# Altium footprint library MOLEX THD.PcbLib: 71 footprints (part 4 of 5)
Each footprint in its own frame and in the unit in brackets; x right, y up, seen from the top. Pads: shape width x height; smd on the part's side, far side on the other; paste and mask are expansions set on the pad; w line width, h text height; cw(c..) or ccw(c..) is an arc to the next point about the centre after c.
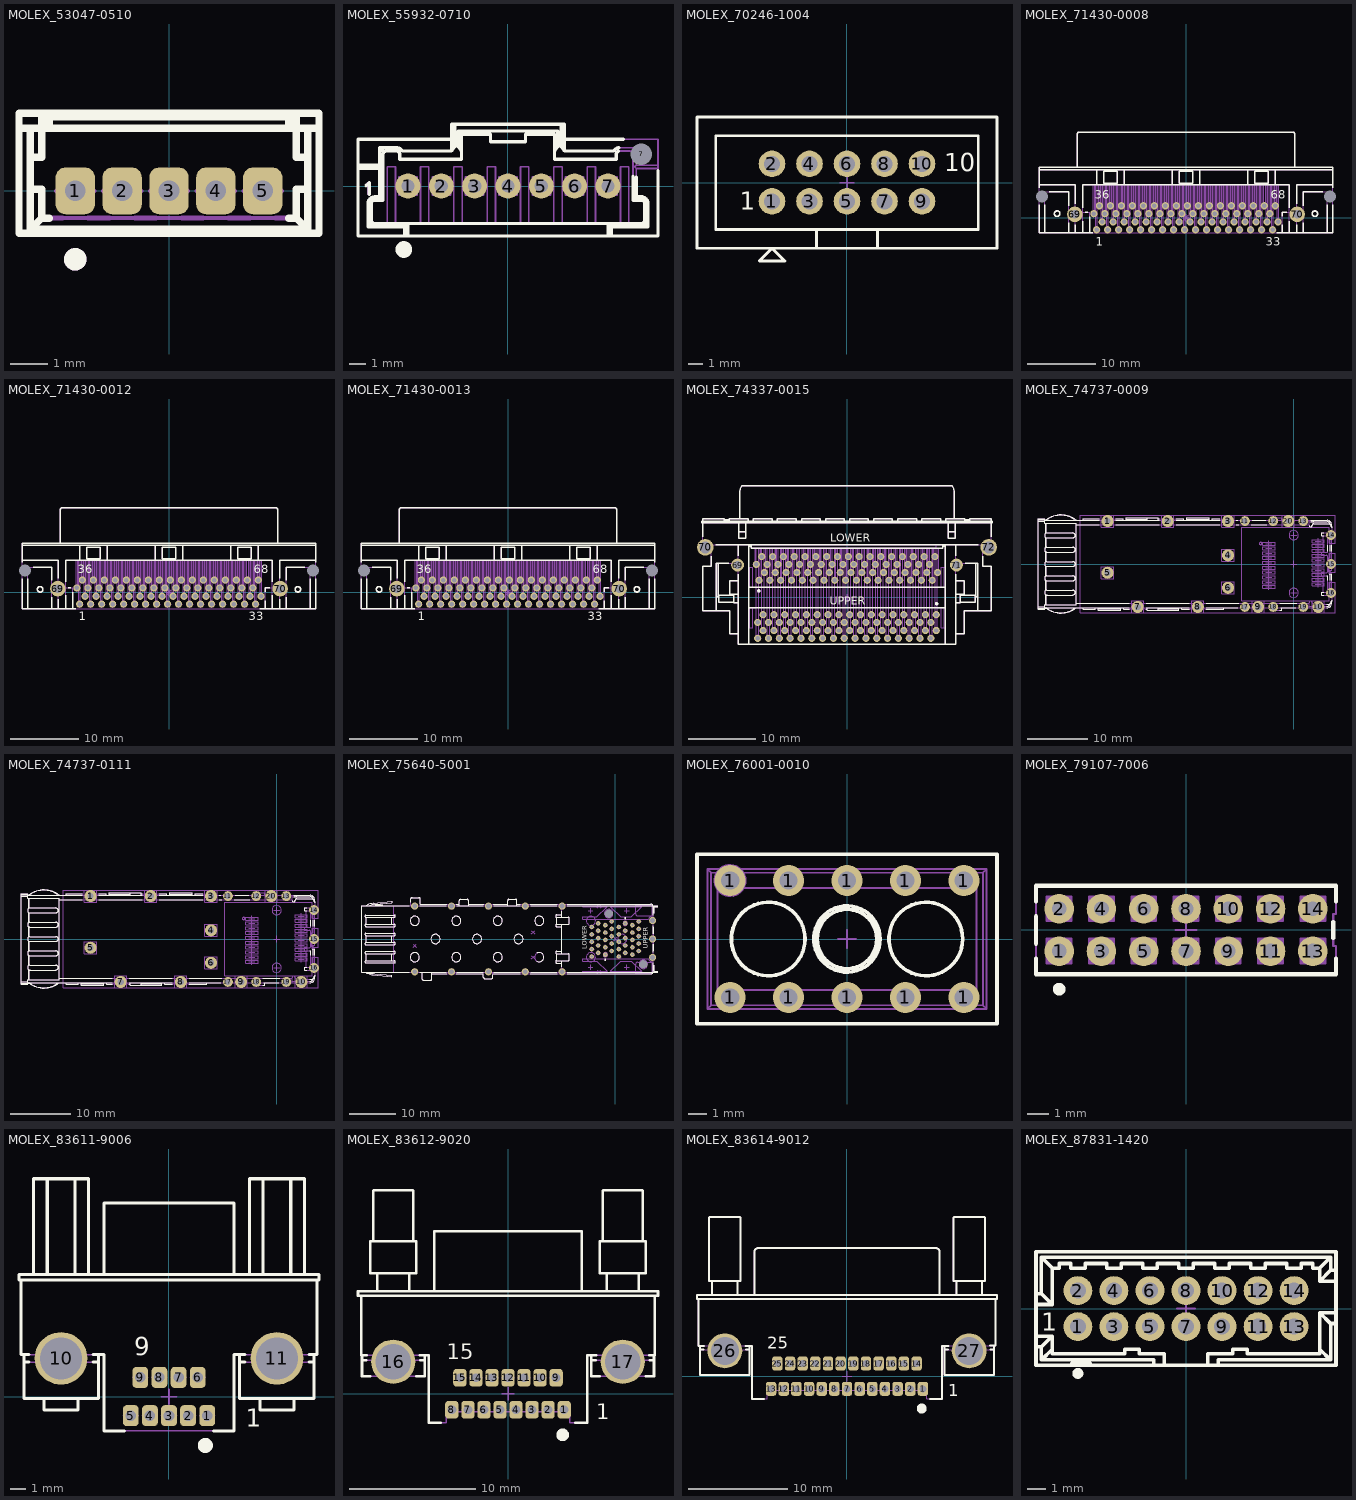
[diagram p3: the footprints below, top view; thin cyan lines are the x and y axes]

## MOLEX_53047-0510 [mm] "1.25mm Pitch PicoBlade™ Wire-to-Board 5 Circuits Vertical Header with Friction Lock"
height 4.2
pads (5):
  rrect50% 1.05x1.25 hole 0.55: 1(-2.5,0) 2(-1.25,0) 3(0,0) 4(1.25,0) 5(2.5,0)
Top Overlay:
  circle w0.3: c-2.5,-1.825 r0.15
  lines w0.2: -4,1.675 4,1.675 ; -3.7,0.05 -3.4,0.05 -3.4,-0.725 ; -3.7,0.9 -3.4,0.9 -3.4,1.975 3.4,1.975 3.4,0.9 3.7,0.9 ; -3.7,1.675 -3.7,-1.025 ; -3.2,-0.725 -3.4,-0.725 ; -3.2,1.675 -3.2,2.075 ; 3.2,-0.725 3.4,-0.725 ; 3.2,1.675 3.2,2.075 ; 3.7,0.05 3.4,0.05 3.4,-0.725 ; 3.7,1.675 3.7,-1.025 ; -3.7,-1.025 3.7,-1.025 ; -3.7,-1.025 -3.4,-0.725 ; 3.4,-0.725 3.7,-1.025 ; -4,-1.125 4,-1.125 4,2.075 -4,2.075 -4,-1.125
Mechanical 3:
  lines w0.127: -3,0 -2.5,0 ; -2.5,-0.5 -2.5,0 ; -2.5,0.5 -2.5,0 ; -2,0 -2.5,0 ; -1.75,0 -1.25,0 ; -1.25,-0.5 -1.25,0 ; -1.25,0.5 -1.25,0 ; -0.75,0 -1.25,0 ; -0.5,0 0,0 ; 0,-0.5 0,0 ; 0,0.5 0,0 ; 0.5,0 0,0 ; 0.75,0 1.25,0 ; 1.25,-0.5 1.25,0 ; 1.75,0 1.25,0 ; 2,0 2.5,0 ; 2.5,-0.5 2.5,0 ; 2.5,0.5 2.5,0 ; 3,0 2.5,0 ; 1.25,0 1.25,0.5 1.25,0
Mechanical 4:
  lines w0.127: -4,1.675 4,1.675 ; -3.7,0.05 -3.4,0.05 -3.4,-0.725 ; -3.7,0.9 -3.4,0.9 -3.4,1.975 3.4,1.975 3.4,0.9 3.7,0.9 ; -3.7,1.675 -3.7,-1.025 ; -3.2,1.675 -3.2,2.075 ; -2.838,-0.725 -3.4,-0.725 ; -2.162,-0.725 -1.588,-0.725 ; -0.912,-0.725 -0.338,-0.725 ; 0.338,-0.725 0.912,-0.725 ; 1.588,-0.725 2.162,-0.725 ; 2.838,-0.725 3.4,-0.725 ; 3.2,1.675 3.2,2.075 ; 3.7,0.05 3.4,0.05 3.4,-0.725 ; 3.7,1.675 3.7,-1.025 ; -3.7,-1.025 3.7,-1.025 ; -3.7,-1.025 -3.4,-0.725 ; 3.4,-0.725 3.7,-1.025 ; -4,-1.125 4,-1.125 4,2.075 -4,2.075 -4,-1.125
Mechanical 8:
  lines w0.1: -3,0 -2.5,0 ; -2.5,-0.5 -2.5,0 ; -2.5,0.5 -2.5,0 ; -2,0 -2.5,0 ; -1.75,0 -1.25,0 ; -1.25,-0.5 -1.25,0 ; -1.25,0.5 -1.25,0 ; -0.75,0 -1.25,0 ; -0.5,0 0,0 ; 0,-0.5 0,0 ; 0,0.5 0,0 ; 0.5,0 0,0 ; 0.75,0 1.25,0 ; 1.25,-0.5 1.25,0 ; 1.75,0 1.25,0 ; 2,0 2.5,0 ; 2.5,-0.5 2.5,0 ; 2.5,0.5 2.5,0 ; 3,0 2.5,0 ; 1.25,0 1.25,0.5 1.25,0
Mechanical 14:
  circle w0.3: c-2.5,-1.825 r0.15
  lines w0.1: -4,1.675 4,1.675 ; -3.7,0.05 -3.4,0.05 -3.4,-0.725 ; -3.7,0.9 -3.4,0.9 -3.4,1.975 3.4,1.975 3.4,0.9 3.7,0.9 ; -3.7,1.675 -3.7,-1.025 ; -3.2,1.675 -3.2,2.075 ; 3.2,1.675 3.2,2.075 ; 3.7,0.05 3.4,0.05 3.4,-0.725 ; 3.7,1.675 3.7,-1.025 ; -3.7,-1.025 3.7,-1.025 ; -3.7,-1.025 -3.4,-0.725 ; -3.4,-0.725 3.4,-0.725 ; -2.66,-0.35 -2.34,-0.35 ; -2.66,-0.35 -2.66,0.35 ; -2.66,-0.35 -2.525,-0.225 ; -2.66,0.35 -2.34,0.35 ; -2.66,0.35 -2.525,0.225 ; -2.525,-0.225 -2.475,-0.225 ; -2.525,-0.225 -2.525,0.225 ; -2.525,0.225 -2.475,0.225 ; -2.475,-0.225 -2.475,0.225 ; -2.475,-0.225 -2.34,-0.35 ; -2.475,0.225 -2.34,0.35 ; -2.34,-0.35 -2.34,0.35 ; -1.41,-0.35 -1.09,-0.35 ; -1.41,-0.35 -1.41,0.35 ; -1.41,-0.35 -1.275,-0.225 ; -1.41,0.35 -1.09,0.35 ; -1.41,0.35 -1.275,0.225 ; -1.275,-0.225 -1.225,-0.225 ; -1.275,-0.225 -1.275,0.225 ; -1.275,0.225 -1.225,0.225 ; -1.225,-0.225 -1.225,0.225 ; -1.225,-0.225 -1.09,-0.35 ; -1.225,0.225 -1.09,0.35 ; -1.09,-0.35 -1.09,0.35 ; -0.16,-0.35 0.16,-0.35 ; -0.16,-0.35 -0.16,0.35 ; -0.16,-0.35 -0.025,-0.225 ; -0.16,0.35 0.16,0.35 ; -0.16,0.35 -0.025,0.225 ; -0.025,-0.225 0.025,-0.225 ; -0.025,-0.225 -0.025,0.225 ; -0.025,0.225 0.025,0.225 ; 0.025,-0.225 0.025,0.225 ; 0.025,-0.225 0.16,-0.35 ; 0.025,0.225 0.16,0.35 ; 0.16,-0.35 0.16,0.35 ; 1.09,-0.35 1.41,-0.35 ; 1.09,-0.35 1.09,0.35 ; 1.09,-0.35 1.225,-0.225 ; 1.09,0.35 1.41,0.35 ; 1.09,0.35 1.225,0.225 ; 1.225,-0.225 1.275,-0.225 ; 1.225,-0.225 1.225,0.225 ; 1.225,0.225 1.275,0.225 ; 1.275,-0.225 1.275,0.225 ; 1.275,-0.225 1.41,-0.35 ; 1.275,0.225 1.41,0.35 ; 1.41,-0.35 1.41,0.35 ; 2.34,-0.35 2.66,-0.35 ; 2.34,-0.35 2.34,0.35 ; 2.34,-0.35 2.475,-0.225 ; 2.34,0.35 2.66,0.35 ; 2.34,0.35 2.475,0.225 ; 2.475,-0.225 2.525,-0.225 ; 2.475,-0.225 2.475,0.225 ; 2.475,0.225 2.525,0.225 ; 2.525,-0.225 2.525,0.225 ; 2.525,-0.225 2.66,-0.35 ; 2.525,0.225 2.66,0.35 ; 2.66,-0.35 2.66,0.35 ; 3.4,-0.725 3.7,-1.025 ; -4,-1.125 4,-1.125 4,2.075 -4,2.075 -4,-1.125
3D body "MOLEX_53047-0510.stp": height 4.2, standoff -2.2, extent -4,-1.125 4,2.075

## MOLEX_55932-0710 [mm] "2.00mm Pitch MicroClasp Wire-to-Board Header, Single Row, Vertical, 7 Circuits, with PCB Locator"
height 9.75
pads (8):
  round 1.5 hole 0.8: 1(-6,0) 2(-4,0) 3(-2,0) 4(0,0) 5(2,0) 6(4,0) 7(6,0)
  round 0.5 hole 1.3 unplated mask+0.4: 7(8,1.9)
Top Overlay:
  circle w0.5: c-6.25,-3.81 r0.25
  lines w0.2: -9,1.05 -7.7,1.05 ; -9,1.25 -7.7,1.25 ; -8.524,0.001 -8.325,0.2 -8.325,-0.5 ; -8.2,-2.05 ccw(c-8,-2.05) -8,-2.25 ; -7.6,1.15 -7.7,1.25 ; -7.5,1.25 -7.7,1.05 ; -7.441,2.041 -7.7,2.3 ; -6.2,-3 -6.2,-2.45 ; -6,-3 -6,-2.25 ; -3.39,2.8 -9,2.8 -9,-3 9,-3 9,0.92 ; -3.19,3.7 -3.19,2.4 ; -2.79,2.1 -2.99,2.4 ; 2.79,2.1 2.99,2.4 ; 3.19,3.7 3.19,2.4 ; 3.39,2.8 6.928,2.8 ; 6,-3 6,-2.25 ; 6.2,-3 6.2,-2.45 ; 6.612,2.079 ccw(c6.7,1.9) 6.5,1.9 6.5,1.6 2.79,1.6 2.79,3.1 1.05,3.1 1.05,2.65 -1.05,2.65 -1.05,3.1 -2.79,3.1 ; 6.658,2.298 ccw(c6.7,1.9) 6.354,2.1 3.39,2.1 ; 7.5,0.592 7.5,-0.85 ; 7.7,0.533 7.7,-0.65 ; 8,-2.25 ccw(c8,-2.05) 8.2,-2.05 ; -8.4,-2.45 -8.4,-1.05 ; -8.4,-2.45 -8.2,-2.25 ; -8.4,-2.45 -6.2,-2.45 ; -8.4,-1.05 cw(c-8,-1.05) -8,-0.65 ; -8.4,-1.05 -8.2,-1.05 ; -8.2,-2.25 -8.2,-1.05 ; -8.2,-2.25 -6,-2.25 ; -8.2,-1.05 cw(c-8,-1.05) -8,-0.85 ; -8,-0.85 -8,-0.65 ; -8,-0.85 -7.5,-0.85 ; -8,-0.65 -7.7,-0.65 ; -7.7,-0.65 -7.7,1.05 ; -7.7,-0.65 -7.5,-0.85 ; -7.7,1.25 -7.7,2.3 ; -7.7,2.3 -6.7,2.3 cw(c-6.7,1.9) -6.354,2.1 -3.39,2.1 ; -7.5,-0.85 -7.5,1.9 cw(c-7.3,1.9) -7.3,2.1 -6.7,2.1 cw(c-6.7,1.9) -6.5,1.9 -6.5,1.6 -2.79,1.6 -2.79,3.1 ; -6.2,-2.45 -6,-2.25 ; -6,-2.25 6,-2.25 ; -3.39,2.1 -3.19,2.4 ; -3.39,2.1 -3.39,3.7 3.39,3.7 3.39,2.1 ; -3.19,2.4 -2.99,2.4 ; -2.99,2.4 -2.99,3.3 ; -2.99,3.3 2.99,3.3 2.99,2.4 ; -2.99,3.3 -2.79,3.1 ; 2.99,2.4 3.19,2.4 ; 3.19,2.4 3.39,2.1 ; 6,-2.25 6.2,-2.45 ; 6,-2.25 8.2,-2.25 ; 6.2,-2.45 8.4,-2.45 ; 7.5,-0.85 7.7,-0.65 ; 7.5,-0.85 8,-0.85 ; 7.7,-0.65 8,-0.65 ; 8,-0.85 cw(c8,-1.05) 8.2,-1.046 ccw(c8,-1.05) 8,-0.85 ; 8,-0.85 8,-0.65 ; 8,-0.65 cw(c8,-1.05) 8.4,-1.05 ; 8.2,-2.25 8.4,-2.45 ; 8.2,-2.25 8.2,-1.05 8.4,-1.05 ; 8.4,-2.45 8.4,-1.05
Mechanical 8:
  lines w0.1: -6.5,0 -6,0 ; -6,-0.5 -6,0 ; -6,0.5 -6,0 ; -5.5,0 -6,0 ; -4.5,0 -4,0 ; -4,-0.5 -4,0 ; -4,0.5 -4,0 ; -3.5,0 -4,0 ; -2.5,0 -2,0 ; -2,-0.5 -2,0 ; -2,0.5 -2,0 ; -1.5,0 -2,0 ; -0.5,0 0,0 ; 0,-0.5 0,0 ; 0,0.5 0,0 ; 0.5,0 0,0 ; 1.5,0 2,0 ; 2,-0.5 2,0 ; 2,0.5 2,0 ; 2.5,0 2,0 ; 3.5,0 4,0 ; 4,-0.5 4,0 ; 4,0.5 4,0 ; 4.5,0 4,0 ; 5.5,0 6,0 ; 6,-0.5 6,0 ; 6,0.5 6,0 ; 6.5,0 6,0 ; 7.5,1.9 8,1.9 ; 8,1.4 8,1.9 ; 8,2.4 8,1.9 ; 8.5,1.9 8,1.9
Mechanical 14:
  drawing of 210 lines, arcs and shapes, not listed
3D body "MOLEX_55932-0710.stp": height 9.75, standoff -3.2, extent -9,-3 9,3.7

## MOLEX_70246-1004 [mm] "2.54mm Pitch C-Grid® Header, Low Profile, Dual Row, Vertical, Shrouded Header"
height 9.27
pads (10):
  round 1.8 hole 1.1: 1(-5.08,-1.27) 2(-5.08,1.27) 3(-2.54,-1.27) 4(-2.54,1.27) 5(0,-1.27) 6(0,1.27) 7(2.54,-1.27) 8(2.54,1.27) 9(5.08,-1.27) 10(5.08,1.27)
Top Overlay:
  lines w0.2: -2.057,-4.445 -2.057,-3.175 ; 2.057,-4.445 2.057,-3.175 ; -10.16,-4.445 10.16,-4.445 10.16,4.445 -10.16,4.445 -10.16,-4.445 ; -8.89,-3.175 8.89,-3.175 8.89,3.175 -8.89,3.175 -8.89,-3.175 ; -5.939,-5.309 -4.211,-5.309 -5.075,-4.445 -5.939,-5.309
  text "1" at -7.28,-1.835 h1.2
  text "10" at 6.595,0.765 h1.2
Mechanical 8:
  lines w0.1: -5.58,-1.27 -5.08,-1.27 ; -5.58,1.27 -5.08,1.27 ; -5.08,-1.77 -5.08,-1.27 ; -5.08,-0.77 -5.08,-1.27 ; -5.08,0.77 -5.08,1.27 ; -5.08,1.77 -5.08,1.27 ; -4.58,-1.27 -5.08,-1.27 ; -4.58,1.27 -5.08,1.27 ; -3.04,-1.27 -2.54,-1.27 ; -3.04,1.27 -2.54,1.27 ; -2.54,-1.77 -2.54,-1.27 ; -2.54,-0.77 -2.54,-1.27 ; -2.54,0.77 -2.54,1.27 ; -2.54,1.77 -2.54,1.27 ; -2.04,-1.27 -2.54,-1.27 ; -2.04,1.27 -2.54,1.27 ; -0.5,-1.27 0,-1.27 ; -0.5,0 0,0 ; -0.5,1.27 0,1.27 ; 0,-1.77 0,-1.27 ; 0,-0.77 0,-1.27 ; 0,-0.5 0,0 ; 0,0.5 0,0 ; 0,0.77 0,1.27 ; 0,1.77 0,1.27 ; 0.5,-1.27 0,-1.27 ; 0.5,0 0,0 ; 0.5,1.27 0,1.27 ; 2.04,-1.27 2.54,-1.27 ; 2.04,1.27 2.54,1.27 ; 2.54,-1.77 2.54,-1.27 ; 2.54,-0.77 2.54,-1.27 ; 2.54,0.77 2.54,1.27 ; 2.54,1.77 2.54,1.27 ; 3.04,-1.27 2.54,-1.27 ; 3.04,1.27 2.54,1.27 ; 4.58,-1.27 5.08,-1.27 ; 4.58,1.27 5.08,1.27 ; 5.08,-1.77 5.08,-1.27 ; 5.08,-0.77 5.08,-1.27 ; 5.08,0.77 5.08,1.27 ; 5.08,1.77 5.08,1.27 ; 5.58,-1.27 5.08,-1.27 ; 5.58,1.27 5.08,1.27
Mechanical 14:
  lines w0.1: -2.057,-4.455 -2.057,-3.185 ; 2.057,-4.455 2.057,-3.185 ; -10.16,-4.455 10.16,-4.455 10.16,4.435 -10.16,4.435 -10.16,-4.455 ; -8.89,-3.185 8.89,-3.185 8.89,3.165 -8.89,3.165 -8.89,-3.185 ; -5.939,-5.309 -4.211,-5.309 -5.075,-4.445 -5.939,-5.309 ; -5.397,-1.597 -4.762,-1.597 -4.762,-0.962 -5.397,-0.962 -5.397,-1.597 ; -5.397,0.943 -4.762,0.943 -4.762,1.578 -5.397,1.578 -5.397,0.943 ; -2.857,-1.597 -2.222,-1.597 -2.222,-0.962 -2.857,-0.962 -2.857,-1.597 ; -2.857,0.943 -2.222,0.943 -2.222,1.578 -2.857,1.578 -2.857,0.943 ; -0.317,-1.597 0.318,-1.597 0.318,-0.962 -0.317,-0.962 -0.317,-1.597 ; -0.317,0.943 0.318,0.943 0.318,1.578 -0.317,1.578 -0.317,0.943 ; 2.223,-1.597 2.858,-1.597 2.858,-0.962 2.223,-0.962 2.223,-1.597 ; 2.223,0.943 2.858,0.943 2.858,1.578 2.223,1.578 2.223,0.943 ; 4.763,-1.597 5.398,-1.597 5.398,-0.962 4.763,-0.962 4.763,-1.597 ; 4.763,0.943 5.398,0.943 5.398,1.578 4.763,1.578 4.763,0.943
  text "1" at -7.28,-1.835 h1.2
  text "10" at 6.595,0.765 h1.2
3D body "MOLEX_70246-1004.stp": height 9.27, standoff -3.43, extent -10.16,-4.445 10.16,4.445

## MOLEX_71430-0008 [mm] "68 Positions, Pitch 0.8mm, Very Hight Density Right Angle Receptacle, VHDCI Standard (Recommended PCB Thickness: 1.6mm)"
height 6.28
pads (72):
  round 1.05 hole 0.65: 1(-13.005,-1.75) 2(-12.205,-0.6) 3(-11.405,-1.75) 4(-10.605,-0.6) 5(-9.805,-1.75) 6(-9.005,-0.6) 7(-8.205,-1.75) 8(-7.405,-0.6) 9(-6.605,-1.75) 10(-5.805,-0.6) 11(-5.005,-1.75) 12(-4.205,-0.6) 13(-3.405,-1.75) 14(-2.605,-0.6) 15(-1.805,-1.75) 16(-1.005,-0.6) 17(-0.205,-1.75) 18(0.595,-0.6) 19(1.395,-1.75) 20(2.195,-0.6) 21(2.995,-1.75) 22(3.795,-0.6) 23(4.595,-1.75) 24(5.395,-0.6) 25(6.195,-1.75) 26(6.995,-0.6) 27(7.795,-1.75) 28(8.595,-0.6) 29(9.395,-1.75) 30(10.195,-0.6) 31(10.995,-1.75) 32(11.795,-0.6) 33(12.595,-1.75) 34(13.395,-0.6) 35(-13.405,0.6) 36(-12.605,1.75) 37(-11.805,0.6) 38(-11.005,1.75) 39(-10.205,0.6) 40(-9.405,1.75) 41(-8.605,0.6) 42(-7.805,1.75) 43(-7.005,0.6) 44(-6.205,1.75) 45(-5.405,0.6) 46(-4.605,1.75) 47(-3.805,0.6) 48(-3.005,1.75) 49(-2.205,0.6) 50(-1.405,1.75) 51(-0.605,0.6) 52(0.195,1.75) 53(0.995,0.6) 54(1.795,1.75) 55(2.595,0.6) 56(3.395,1.75) 57(4.195,0.6) 58(4.995,1.75) 59(5.795,0.6) 60(6.595,1.75) 61(7.395,0.6) 62(8.195,1.75) 63(8.995,0.6) 64(9.795,1.75) 65(10.595,0.6) 66(11.395,1.75) 67(12.195,0.6) 68(12.995,1.75)
  round 2.25 hole 1.2: 69(-16.175,0.5) 70(16.175,0.5)
  round 0.5 hole 1.75 unplated mask+0.625: 71(-20.95,3.13) 72(20.95,3.13)
Top Overlay:
  circle w0.2: c-18.75,0.6 r0.4
  circle w0.2: c18.75,0.6 r0.4
  lines w0.2: -21.35,1.919 -21.35,-2.2 -13.591,-2.2 ; -21.35,4.341 -21.35,7.331 21.35,7.331 21.35,4.341 ; -21.35,4.8 -16.15,4.8 -16.15,2.025 ; -21.35,7 21.35,7 ; -20.55,-2.2 -20.55,1.919 ; -19.865,3.8 -17.05,3.8 -17.05,1.749 ; -17.05,-2.2 -17.05,-0.749 ; -16.15,-2.2 -16.15,-1.025 ; -15.796,7.331 -15.796,12.25 cw(c-15.596,12.25) -15.596,12.45 15.596,12.45 cw(c15.596,12.25) 15.796,12.25 15.796,7.331 ; -15,-2.2 -15,-0.472 ; -15,1.472 -15,4.8 15,4.8 15,1.472 ; -14.68,0.8 -14.28,0.8 ; -14,-2.2 -14,0.158 ; -13,4.8 -13,6.998 ; -9,4.8 -8.995,7 ; -2,4.8 -2,6.998 ; 2,4.8 2,6.998 ; 9,4.8 9,6.998 ; 13,4.8 13,6.998 ; 13.181,-2.2 21.35,-2.2 21.35,1.919 ; 14,-2.2 14,-1.032 ; 14,0.232 14,0.8 14.68,0.8 ; 15,-2.2 15,-0.472 ; 16.15,-2.2 16.15,-1.025 ; 16.15,2.025 16.15,4.8 21.35,4.8 ; 17.05,-2.2 17.05,-0.749 ; 17.05,1.749 17.05,3.8 19.865,3.8 ; 20.55,-2.2 20.55,1.919 ; -12,5.05 -10,5.05 -10,6.75 -12,6.75 -12,5.05 ; -1,5.05 1,5.05 1,6.75 -1,6.75 -1,5.05 ; 10,5.05 12,5.05 12,6.75 10,6.75 10,5.05
  text "36" at -13.294,2.761 h1.2
  text "1" at -13.159,-4.073 h1.2
  text "68" at 12.306,2.761 h1.2
  text "33" at 11.62,-4.071 h1.2
Mechanical 8:
  drawing of 298 lines, arcs and shapes, not listed
  text "EDGE OF PCB" at -4.017,7.222 h1
Mechanical 14:
  drawing of 251 lines, arcs and shapes, not listed
3D body "MOLEX_71430-0008.stp": height 6.28, standoff -2.48, extent -21.35,-2.2 21.35,12.45

## MOLEX_71430-0012 [mm] "68 Positions, Pitch 0.8mm, Very Hight Density Right Angle Receptacle, VHDCI Standard (Recommended PCB Thickness: 2.36mm)"
height 6.28
pads (72):
  round 1.05 hole 0.65: 1(-13.005,-1.75) 2(-12.205,-0.6) 3(-11.405,-1.75) 4(-10.605,-0.6) 5(-9.805,-1.75) 6(-9.005,-0.6) 7(-8.205,-1.75) 8(-7.405,-0.6) 9(-6.605,-1.75) 10(-5.805,-0.6) 11(-5.005,-1.75) 12(-4.205,-0.6) 13(-3.405,-1.75) 14(-2.605,-0.6) 15(-1.805,-1.75) 16(-1.005,-0.6) 17(-0.205,-1.75) 18(0.595,-0.6) 19(1.395,-1.75) 20(2.195,-0.6) 21(2.995,-1.75) 22(3.795,-0.6) 23(4.595,-1.75) 24(5.395,-0.6) 25(6.195,-1.75) 26(6.995,-0.6) 27(7.795,-1.75) 28(8.595,-0.6) 29(9.395,-1.75) 30(10.195,-0.6) 31(10.995,-1.75) 32(11.795,-0.6) 33(12.595,-1.75) 34(13.395,-0.6) 35(-13.405,0.6) 36(-12.605,1.75) 37(-11.805,0.6) 38(-11.005,1.75) 39(-10.205,0.6) 40(-9.405,1.75) 41(-8.605,0.6) 42(-7.805,1.75) 43(-7.005,0.6) 44(-6.205,1.75) 45(-5.405,0.6) 46(-4.605,1.75) 47(-3.805,0.6) 48(-3.005,1.75) 49(-2.205,0.6) 50(-1.405,1.75) 51(-0.605,0.6) 52(0.195,1.75) 53(0.995,0.6) 54(1.795,1.75) 55(2.595,0.6) 56(3.395,1.75) 57(4.195,0.6) 58(4.995,1.75) 59(5.795,0.6) 60(6.595,1.75) 61(7.395,0.6) 62(8.195,1.75) 63(8.995,0.6) 64(9.795,1.75) 65(10.595,0.6) 66(11.395,1.75) 67(12.195,0.6) 68(12.995,1.75)
  round 2.25 hole 1.2: 69(-16.175,0.5) 70(16.175,0.5)
  round 0.5 hole 1.75 unplated mask+0.625: 71(-20.95,3.13) 72(20.95,3.13)
Top Overlay:
  circle w0.2: c-18.75,0.4 r0.4
  circle w0.2: c18.75,0.4 r0.4
  lines w0.2: -21.35,1.919 -21.35,-2.4 -13.591,-2.4 ; -21.35,4.341 -21.35,7.131 21.35,7.131 21.35,4.341 ; -21.35,4.6 -16.15,4.6 -16.15,2.025 ; -21.35,6.8 21.35,6.8 ; -20.55,-2.4 -20.55,1.919 ; -19.765,3.6 -17.05,3.6 -17.05,1.749 ; -17.05,-2.4 -17.05,-0.749 ; -16.15,-2.4 -16.15,-1.025 ; -15.796,7.131 -15.796,12.05 cw(c-15.596,12.05) -15.596,12.25 15.596,12.25 cw(c15.596,12.05) 15.796,12.05 15.796,7.131 ; -15,-2.4 -15,-0.472 ; -15,1.472 -15,4.6 15,4.6 15,1.472 ; -14.653,0.6 -14.28,0.6 ; -14,-2.4 -14,-0.042 ; -13,4.6 -13,6.798 ; -9,4.6 -8.995,6.8 ; -2,4.6 -2,6.798 ; 2,4.6 2,6.798 ; 9,4.6 9,6.798 ; 13,4.6 13,6.798 ; 13.181,-2.4 21.35,-2.4 21.35,1.919 ; 14,-2.4 14,-1.232 ; 14,0.032 14,0.6 14.653,0.6 ; 15,-2.4 15,-0.472 ; 16.15,-2.4 16.15,-1.025 ; 16.15,2.025 16.15,4.6 21.35,4.6 ; 17.05,-2.4 17.05,-0.749 ; 17.05,1.749 17.05,3.6 19.765,3.6 ; 20.55,-2.4 20.55,1.919 ; -12,4.85 -10,4.85 -10,6.55 -12,6.55 -12,4.85 ; -1,4.85 1,4.85 1,6.55 -1,6.55 -1,4.85 ; 10,4.85 12,4.85 12,6.55 10,6.55 10,4.85
  text "33" at 11.62,-4.071 h1.2
  text "68" at 12.306,2.761 h1.2
  text "1" at -13.159,-4.073 h1.2
  text "36" at -13.294,2.761 h1.2
Mechanical 8:
  drawing of 298 lines, arcs and shapes, not listed
  text "EDGE OF PCB" at -4.017,7.222 h1
Mechanical 14:
  drawing of 251 lines, arcs and shapes, not listed
  text "33" at 11.62,-4.071 h1.2
  text "1" at -13.159,-4.073 h1.2
3D body "MOLEX_71430-0012.stp": height 6.28, standoff -2.71, extent -21.35,-2.4 21.35,12.25

## MOLEX_71430-0013 [mm] "68 Positions, Pitch 0.8mm, Very Hight Density Right Angle Receptacle, VHDCI Standard (Recommended PCB Thickness: 1.6mm)"
height 6.28
pads (72):
  round 1.05 hole 0.65: 1(-13.005,-1.75) 2(-12.205,-0.6) 3(-11.405,-1.75) 4(-10.605,-0.6) 5(-9.805,-1.75) 6(-9.005,-0.6) 7(-8.205,-1.75) 8(-7.405,-0.6) 9(-6.605,-1.75) 10(-5.805,-0.6) 11(-5.005,-1.75) 12(-4.205,-0.6) 13(-3.405,-1.75) 14(-2.605,-0.6) 15(-1.805,-1.75) 16(-1.005,-0.6) 17(-0.205,-1.75) 18(0.595,-0.6) 19(1.395,-1.75) 20(2.195,-0.6) 21(2.995,-1.75) 22(3.795,-0.6) 23(4.595,-1.75) 24(5.395,-0.6) 25(6.195,-1.75) 26(6.995,-0.6) 27(7.795,-1.75) 28(8.595,-0.6) 29(9.395,-1.75) 30(10.195,-0.6) 31(10.995,-1.75) 32(11.795,-0.6) 33(12.595,-1.75) 34(13.395,-0.6) 35(-13.405,0.6) 36(-12.605,1.75) 37(-11.805,0.6) 38(-11.005,1.75) 39(-10.205,0.6) 40(-9.405,1.75) 41(-8.605,0.6) 42(-7.805,1.75) 43(-7.005,0.6) 44(-6.205,1.75) 45(-5.405,0.6) 46(-4.605,1.75) 47(-3.805,0.6) 48(-3.005,1.75) 49(-2.205,0.6) 50(-1.405,1.75) 51(-0.605,0.6) 52(0.195,1.75) 53(0.995,0.6) 54(1.795,1.75) 55(2.595,0.6) 56(3.395,1.75) 57(4.195,0.6) 58(4.995,1.75) 59(5.795,0.6) 60(6.595,1.75) 61(7.395,0.6) 62(8.195,1.75) 63(8.995,0.6) 64(9.795,1.75) 65(10.595,0.6) 66(11.395,1.75) 67(12.195,0.6) 68(12.995,1.75)
  round 2.25 hole 1.2: 69(-16.175,0.5) 70(16.175,0.5)
  round 0.5 hole 1.75 unplated mask+0.625: 71(-20.95,3.13) 72(20.95,3.13)
Top Overlay:
  circle w0.2: c18.75,0.4 r0.4
  circle w0.2: c-18.75,0.4 r0.4
  lines w0.2: -21.35,1.919 -21.35,-2.4 -13.591,-2.4 ; -21.35,4.341 -21.35,7.131 21.35,7.131 21.35,4.341 ; -21.35,4.6 -16.15,4.6 -16.15,2.025 ; -21.35,6.8 21.35,6.8 ; -20.55,-2.4 -20.55,1.919 ; -19.765,3.6 -17.05,3.6 -17.05,1.749 ; -17.05,-2.4 -17.05,-0.749 ; -16.15,-2.4 -16.15,-1.025 ; -15.796,7.131 -15.796,12.05 cw(c-15.596,12.05) -15.596,12.25 15.596,12.25 cw(c15.596,12.05) 15.796,12.05 15.796,7.131 ; -15,-2.4 -15,-0.472 ; -15,1.472 -15,4.6 15,4.6 15,1.472 ; -14.653,0.6 -14.28,0.6 ; -14,-2.4 -14,-0.042 ; -13,4.6 -13,6.798 ; -9,4.6 -8.995,6.8 ; -2,4.6 -2,6.798 ; 2,4.6 2,6.798 ; 9,4.6 9,6.798 ; 13,4.6 13,6.798 ; 13.181,-2.4 21.35,-2.4 21.35,1.919 ; 14,-2.4 14,-1.232 ; 14,0.032 14,0.6 14.653,0.6 ; 15,-2.4 15,-0.472 ; 16.15,-2.4 16.15,-1.025 ; 16.15,2.025 16.15,4.6 21.35,4.6 ; 17.05,-2.4 17.05,-0.749 ; 17.05,1.749 17.05,3.6 19.765,3.6 ; 20.55,-2.4 20.55,1.919 ; -12,4.85 -12,6.55 -10,6.55 -10,4.85 -12,4.85 ; -1,4.85 -1,6.55 1,6.55 1,4.85 -1,4.85 ; 10,4.85 10,6.55 12,6.55 12,4.85 10,4.85
  text "36" at -13.294,2.761 h1.2
  text "1" at -13.159,-4.073 h1.2
  text "68" at 12.306,2.761 h1.2
  text "33" at 11.62,-4.071 h1.2
Mechanical 8:
  drawing of 298 lines, arcs and shapes, not listed
  text "EDGE OF PCB" at -4.017,7.222 h1
Mechanical 14:
  drawing of 251 lines, arcs and shapes, not listed
  text "1" at -13.159,-4.073 h1.2
  text "33" at 11.62,-4.071 h1.2
3D body "MOLEX_71430-0013.stp": height 6.28, standoff -2.48, extent -21.35,-2.4 21.35,12.25

## MOLEX_74337-0015 [mm] "2x68 Positions, Pitch 0.8mm, Very Hight Density Right Angle Dual Stacked VHDCI Receptacle"
height 10.78
pads (140):
  round 1.9 hole 1.2: 69(-16.175,4.79) 71(16.175,4.79)
  round 2.45 hole 1.75: 70(-20.95,7.41) 72(20.95,7.41)
  round 1.05 hole 0.65: L1(-13.005,2.54) L2(-12.205,3.69) L3(-11.405,2.54) L4(-10.605,3.69) L5(-9.805,2.54) L6(-9.005,3.69) L7(-8.205,2.54) L8(-7.405,3.69) L9(-6.605,2.54) L10(-5.805,3.69) L11(-5.005,2.54) L12(-4.205,3.69) L13(-3.405,2.54) L14(-2.605,3.69) L15(-1.805,2.54) L16(-1.005,3.69) L17(-0.205,2.54) L18(0.595,3.69) L19(1.395,2.54) L20(2.195,3.69) L21(2.995,2.54) L22(3.795,3.69) L23(4.595,2.54) L24(5.395,3.69) L25(6.195,2.54) L26(6.995,3.69) L27(7.795,2.54) L28(8.595,3.69) L29(9.395,2.54) L30(10.195,3.69) L31(10.995,2.54) L32(11.795,3.69) L33(12.595,2.54) L34(13.395,3.69) L35(-13.405,4.89) L36(-12.605,6.04) L37(-11.805,4.89) L38(-11.005,6.04) L39(-10.205,4.89) L40(-9.405,6.04) L41(-8.605,4.89) L42(-7.805,6.04) L43(-7.005,4.89) L44(-6.205,6.04) L45(-5.405,4.89) L46(-4.605,6.04) L47(-3.805,4.89) L48(-3.005,6.04) L49(-2.205,4.89) L50(-1.405,6.04) L51(-0.605,4.89) L52(0.195,6.04) L53(0.995,4.89) L54(1.795,6.04) L55(2.595,4.89) L56(3.395,6.04) L57(4.195,4.89) L58(4.995,6.04) L59(5.795,4.89) L60(6.595,6.04) L61(7.395,4.89) L62(8.195,6.04) L63(8.995,4.89) L64(9.795,6.04) L65(10.595,4.89) L66(11.395,6.04) L67(12.195,4.89) L68(12.995,6.04) U1(13.195,-2.54) U2(12.395,-3.69) U3(11.595,-2.54) U4(10.795,-3.69) U5(9.995,-2.54) U6(9.195,-3.69) U7(8.395,-2.54) U8(7.595,-3.69) U9(6.795,-2.54) U10(5.995,-3.69) U11(5.195,-2.54) U12(4.395,-3.69) U13(3.595,-2.54) U14(2.795,-3.69) U15(1.995,-2.54) U16(1.195,-3.69) U17(0.395,-2.54) U18(-0.405,-3.69) U19(-1.205,-2.54) U20(-2.005,-3.69) U21(-2.805,-2.54) U22(-3.605,-3.69) U23(-4.405,-2.54) U24(-5.205,-3.69) U25(-6.005,-2.54) U26(-6.805,-3.69) U27(-7.605,-2.54) U28(-8.405,-3.69) U29(-9.205,-2.54) U30(-10.005,-3.69) U31(-10.805,-2.54) U32(-11.605,-3.69) U33(-12.405,-2.54) U34(-13.205,-3.69) U35(13.195,-4.89) U36(12.395,-6.04) U37(11.595,-4.89) U38(10.795,-6.04) U39(9.995,-4.89) U40(9.195,-6.04) U41(8.395,-4.89) U42(7.595,-6.04) U43(6.795,-4.89) U44(5.995,-6.04) U45(5.195,-4.89) U46(4.395,-6.04) U47(3.595,-4.89) U48(2.795,-6.04) U49(1.995,-4.89) U50(1.195,-6.04) U51(0.395,-4.89) U52(-0.405,-6.04) U53(-1.205,-4.89) U54(-2.005,-6.04) U55(-2.805,-4.89) U56(-3.605,-6.04) U57(-4.405,-4.89) U58(-5.205,-6.04) U59(-6.005,-4.89) U60(-6.805,-6.04) U61(-7.605,-4.89) U62(-8.405,-6.04) U63(-9.205,-4.89) U64(-10.005,-6.04) U65(-10.805,-4.89) U66(-11.605,-6.04) U67(-12.405,-4.89) U68(-13.205,-6.04)
Top Overlay:
  drawing of 207 lines, arcs and shapes, not listed
  text "UPPER" at -2.559,-1.048 h1.2
  text "LOWER" at -2.509,8.242 h1.2
Mechanical 1:
  circle w0.25: c13.253,-0.92 r0.125
  circle w0.25: c-13.038,0.98 r0.125
Mechanical 8:
  drawing of 565 lines, arcs and shapes, not listed
Mechanical 14:
  drawing of 493 lines, arcs and shapes, not listed
  text "UPPER" at -2.559,-1.048 h1.2
  text "LOWER" at -2.509,8.242 h1.2
3D body "MOLEX_74337-0015.stp": height 12.77, standoff -2.48, extent -21.5,-6.89 21.5,16.5
